# Altium footprint library LimeMicroAltiumLib_pcbLib.PcbLib: 228 footprints (part 2 of 15) (continued)
## ALTR-FBGA896_A-200 [mm] "BGA, 896-Balls, Body 31x31mm, Pitch 1mm" (continued)
Top Overlay:
  circle w0.25: c-16.15,15.35 r0.125
  region: -14.5,15.5 -15.5,14.5 -15.5,15.5
  lines w0.2: -15.5,14.5 -14.5,15.5 ; -15.5,-15.5 15.5,-15.5 15.5,15.5 -15.5,15.5 -15.5,-15.5
Mechanical 13:
  lines w0.1: -15.5,-15.5 15.5,-15.5 15.5,15.5 -15.5,15.5 -15.5,-15.5
Mechanical 15:
  circle w0.35: c-15.2,15.2 r0.1
  lines w0.05: -16,-16 16,-16 16,16 -16,16 -16,-16
  lines w0.1: -0.5,0 0.5,0 ; 0,-0.5 0,0.5
  text ".Designator" at 0,0 h0.7
3D body: height 2, standoff 0.4, extent -15.5,-15.5 15.5,15.5

## AMP_MICTOR38 [mm]
pads (38):
  rect 1.27x0.43 smd: 1(-3.53,5.76) 2(3.53,5.76) 3(-3.53,5.12) 4(3.53,5.12) 5(-3.53,4.48) 6(3.53,4.48) 7(-3.53,3.84) 8(3.53,3.84) 9(-3.53,3.2) 10(3.53,3.2) 11(-3.53,2.56) 12(3.53,2.56) 13(-3.53,1.92) 14(3.53,1.92) 15(-3.53,1.28) 16(3.53,1.28) 17(-3.53,0.64) 18(3.53,0.64) 19(-3.53,0) 20(3.53,0) 21(-3.53,-0.64) 22(3.53,-0.64) 23(-3.53,-1.28) 24(3.53,-1.28) 25(-3.53,-1.92) 26(3.53,-1.92) 27(-3.53,-2.56) 28(3.53,-2.56) 29(-3.53,-3.2) 30(3.53,-3.2) 31(-3.53,-3.84) 32(3.53,-3.84) 33(-3.53,-4.48) 34(3.53,-4.48) 35(-3.53,-5.12) 36(3.53,-5.12) 37(-3.53,-5.76) 38(3.53,-5.76)
via 0,11.475 diameter 2 hole 2
via 0,5.12 diameter 1 hole 0.8
via 0,-5.12 diameter 1 hole 0.8
via 0,-2.56 diameter 1 hole 0.8
via 0,0 diameter 1 hole 0.8
via 0,2.56 diameter 1 hole 0.8
Top Overlay:
  lines w0.2: -4.5,-12 4.5,-12 4.5,13 -4.5,13 -4.5,-12
Mechanical 15:
  lines w0.3: -4.5,-12 4.5,-12 4.5,13 -4.5,13 -4.5,-12
  text ".Designator" at 0,0 h0.7
  text "1" at -3.6,6.5 h1
  text "2" at 3.1,6.5 h1
  text "37" at -3.6,-7.8 h1
  text "38" at 2,-7.7 h1

## AP7361 [mm] "Low noise LDO"
height 0.63
pads (9):
  rect 0.7x0.3 smd mask+0.05: 1(-1.375,0.975) 2(-1.375,0.325) 3(-1.375,-0.325) 4(-1.375,-0.975) 5(1.375,-0.975) 6(1.375,-0.325) 7(1.375,0.325) 8(1.375,0.975)
  rect 1.6x2.35 smd mask+0.05: 9(0,0)
Top Overlay:
  circle w0.2: c-2.3,1 r0.035
  lines w0.15: -2,-0.8 -2,-1.7 -1.4,-1.7 ; -2,0.8 -2,1.7 -1.4,1.7 ; 1.4,-1.7 2,-1.7 2,-0.8 ; 1.4,1.7 2,1.7 2,0.8
Mechanical 15:
  circle w0.2: c-1.4,0.8 r0.1
  lines w0.15: -0.4,0 0,0 ; 0,-0.4 0,0 ; 0,0.4 0,0 ; 0.4,0 0,0 ; -1.9,-1.5 -1.9,1.5 1.9,1.5 1.9,-1.5 -1.9,-1.5
  text ".Designator" at 0,0 h0.55
3D body "User Library-DFN8_3x3mm__65mm.step": height 0.8, standoff 0, extent -1.52,-1.5 1.5,1.5

## AS4C64M16D2 [mm]
height 1.2
pads (84):
  round 0.45 smd: A1(-3.2,5.6) A2(-2.4,5.6) A3(-1.6,5.6) A7(1.6,5.6) A8(2.4,5.6) A9(3.2,5.6) B1(-3.2,4.8) B2(-2.4,4.8) B3(-1.6,4.8) B7(1.6,4.8) B8(2.4,4.8) B9(3.2,4.8) C1(-3.2,4) C2(-2.4,4) C3(-1.6,4) C7(1.6,4) C8(2.4,4) C9(3.2,4) D1(-3.2,3.2) D2(-2.4,3.2) D3(-1.6,3.2) D7(1.6,3.2) D8(2.4,3.2) D9(3.2,3.2) E1(-3.2,2.4) E2(-2.4,2.4) E3(-1.6,2.4) E7(1.6,2.4) E8(2.4,2.4) E9(3.2,2.4) F1(-3.2,1.6) F2(-2.4,1.6) F3(-1.6,1.6) F7(1.6,1.6) F8(2.4,1.6) F9(3.2,1.6) G1(-3.2,0.8) G2(-2.4,0.8) G3(-1.6,0.8) G7(1.6,0.8) G8(2.4,0.8) G9(3.2,0.8) H1(-3.2,0) H2(-2.4,0) H3(-1.6,0) H7(1.6,0) H8(2.4,0) H9(3.2,0) J1(-3.2,-0.8) J2(-2.4,-0.8) J3(-1.6,-0.8) J7(1.6,-0.8) J8(2.4,-0.8) J9(3.2,-0.8) K2(-2.4,-1.6) K3(-1.6,-1.6) K7(1.6,-1.6) K8(2.4,-1.6) K9(3.2,-1.6) L1(-3.2,-2.4) L2(-2.4,-2.4) L3(-1.6,-2.4) L7(1.6,-2.4) L8(2.4,-2.4) M2(-2.4,-3.2) M3(-1.6,-3.2) M7(1.6,-3.2) M8(2.4,-3.2) M9(3.2,-3.2) N1(-3.2,-4) N2(-2.4,-4) N3(-1.6,-4) N7(1.6,-4) N8(2.4,-4) P2(-2.4,-4.8) P3(-1.6,-4.8) P7(1.6,-4.8) P8(2.4,-4.8) P9(3.2,-4.8) R1(-3.2,-5.6) R2(-2.4,-5.6) R3(-1.6,-5.6) R7(1.6,-5.6) R8(2.4,-5.6)
Top Overlay:
  circle w0.25: c-4.3,6.6 r0.125
  lines w0.1: -4.1,-6.4 -4.1,6.4 4.1,6.4 4.1,-6.4 -4.1,-6.4
Mechanical 13:
  lines w0.1: -4.1,-6.4 4.1,-6.4 4.1,6.4 -4.1,6.4 -4.1,-6.4
Mechanical 15:
  circle w0.35: c-3.6,5.6 r0.1
  lines w0.05: -4.1,-6.4 4.1,-6.4 4.1,6.35 -4.1,6.35 -4.1,-6.4
  lines w0.1: -0.5,-0.4 0.5,-0.4 ; 0,-0.9 0,0.1
  text ".Designator" at 0,-0.4 h0.7
3D body: height 1.25, standoff 0, extent -3.6,5.2 -2.8,6
3D body: height 1.2, standoff 0, extent -4,-6.25 4,6.25

## AS4C128M16D3 [mm]
height 1.2
pads (96):
  round 0.41 smd: A1(-3.2,6) A2(-2.4,6) A3(-1.6,6) A7(1.6,6) A8(2.4,6) A9(3.2,6) B1(-3.2,5.2) B2(-2.4,5.2) B3(-1.6,5.2) B7(1.6,5.2) B8(2.4,5.2) B9(3.2,5.2) C1(-3.2,4.4) C2(-2.4,4.4) C3(-1.6,4.4) C7(1.6,4.4) C8(2.4,4.4) C9(3.2,4.4) D1(-3.2,3.6) D2(-2.4,3.6) D3(-1.6,3.6) D7(1.6,3.6) D8(2.4,3.6) D9(3.2,3.6) E1(-3.2,2.8) E2(-2.4,2.8) E3(-1.6,2.8) E7(1.6,2.8) E8(2.4,2.8) E9(3.2,2.8) F1(-3.2,2) F2(-2.4,2) F3(-1.6,2) F7(1.6,2) F8(2.4,2) F9(3.2,2) G1(-3.2,1.2) G2(-2.4,1.2) G3(-1.6,1.2) G7(1.6,1.2) G8(2.4,1.2) G9(3.2,1.2) H1(-3.2,0.4) H2(-2.4,0.4) H3(-1.6,0.4) H7(1.6,0.4) H8(2.4,0.4) H9(3.2,0.4) J1(-3.2,-0.4) J2(-2.4,-0.4) J3(-1.6,-0.4) J7(1.6,-0.4) J8(2.4,-0.4) J9(3.2,-0.4) K1(-3.2,-1.2) K2(-2.4,-1.2) K3(-1.6,-1.2) K7(1.6,-1.2) K8(2.4,-1.2) K9(3.2,-1.2) L1(-3.2,-2) L2(-2.4,-2) L3(-1.6,-2) L7(1.6,-2) L8(2.4,-2) L9(3.2,-2) M1(-3.2,-2.8) M2(-2.4,-2.8) M3(-1.6,-2.8) M7(1.6,-2.8) M8(2.4,-2.8) M9(3.2,-2.8) N1(-3.2,-3.6) N2(-2.4,-3.6) N3(-1.6,-3.6) N7(1.6,-3.6) N8(2.4,-3.6) N9(3.2,-3.6) P1(-3.2,-4.4) P2(-2.4,-4.4) P3(-1.6,-4.4) P7(1.6,-4.4) P8(2.4,-4.4) P9(3.2,-4.4) R1(-3.2,-5.2) R2(-2.4,-5.2) R3(-1.6,-5.2) R7(1.6,-5.2) R8(2.4,-5.2) R9(3.2,-5.2) T1(-3.2,-6) T2(-2.4,-6) T3(-1.6,-6) T7(1.6,-6) T8(2.4,-6) T9(3.2,-6)
Top Overlay:
  circle w0.25: c-4.71,6.71 r0.125
  lines w0.1: -4.5,-6.5 4.5,-6.5 4.5,6.5 -4.5,6.5 -4.5,-6.5
Mechanical 13:
  lines w0.1: -4.5,-6.5 -4.5,6.5 4.5,6.5 4.5,-6.5 -4.5,-6.5
Mechanical 15:
  circle w0.35: c-4.3,6.3 r0.1
  lines w0.05: -4.75,-6.75 -4.75,6.75 4.75,6.75 4.75,-6.75 -4.75,-6.75
  lines w0.1: -0.5,0 0.5,0 ; 0,-0.5 0,0.5
  text ".Designator" at 0,0 h0.7
3D body: height 1.2, standoff 0.25, extent -4.5,-6.5 4.5,6.5

## ATX4PIN12V_MOLEX [mm]
pads (4):
  rrect50% 3x3 hole 1.4: 1(-2.1,2.75)
  round 3 hole 1.4: 2(2.1,2.75) 3(-2.1,-2.75) 4(2.1,-2.75)
Top Overlay:
  lines w0.2: -0.9,-5.85 -0.9,-6.55 1.1,-6.55 1.1,-5.85 ; -5.3,-5.8 -5.3,5.1 5.4,5.1 5.4,-5.8 -5.3,-5.8
Mechanical 15:
  lines w0.2: -0.9,-5.85 -0.9,-6.55 1.1,-6.55 1.1,-5.85 ; -5.3,-5.8 5.4,-5.8 5.4,5.1 -5.3,5.1 -5.3,-5.8
  text ".Designator" at -0.1,-0.25 h0.7
3D body "039281043.stp": height 12.8, standoff -3.5, extent -5.2,-6 5.2,5

## ATX4PIN12V_MOLEX_HORIZONTAL [mm]
pads (5):
  round 3 hole 3.1: 0(0,-10.05)
  rrect50% 3.5x3.5 hole 1.8: 1(2.1,-2.75)
  round 3.5 hole 1.8: 2(-2.1,-2.75) 3(2.1,2.75) 4(-2.1,2.75)
Top Overlay:
  lines w0.2: -5,-16.6 -5,5.1 5.35,5.1 5.35,-16.6 -5,-16.6
Mechanical 15:
  lines w0.2: -5,-16.6 5.35,-16.6 5.35,5.1 -5,5.1 -5,-16.6
  text ".Designator" at -0.1,-0.25 h0.7
3D body "039301041.stp": height 11.4, standoff -3.6, extent -4.8,-16.668 5.2,3.268

## BF1105R_SOT143R4 [mm] "RF MOSFET Transistors Trans MOSFET N-CH 7V 0.03A 4pin(3+Tab). SOT-143R-4 package"
pads (4):
  rect 1x0.7 smd: 1(0.763,-0.987)
  rect 0.7x0.7 smd: 2(-0.962,-0.987) 3(-0.937,0.988) 4(0.963,0.988)
Top Overlay:
  circle w0.15: c0.75,-1.65 r0.075
  lines w0.1: -1.5,-0.6 -1.5,0.625 ; 1.525,-0.6 1.525,0.625
Mechanical 15:
  circle w0.15: c0.75,-0.975 r0.056
  lines w0.1: -1.5,-1.4 -1.5,1.4 1.525,1.4 1.525,-1.4 -1.5,-1.4
  text ".Designator" at 0,0 h0.55
3D body "User Library-SOT143R.STEP": height 0.95, standoff 0.02, extent -1.438,-1.262 1.463,1.238

## BSC093N04LS_G [mm] "SON, 8-Leads, Body 5,32x6,15mm, Pitch 1,27mm, Thermal Pad 3,60x4,05mm, IPC Medium Density"
height 1.1
pads (9):
  rect 1.2x0.5 smd: 1(-2.87,1.905) 2(-2.87,0.635) 3(-2.87,-0.635) 4(-2.87,-1.905) 5(2.87,-1.905) 6(2.87,-0.635) 7(2.87,0.635) 8(2.87,1.905)
  rect 4.05x4.3 smd paste-2.025: 8(1,0)
Top Overlay:
  circle w0.1: c-3.725,2.895 r0.05
  lines w0.2: -3.325,-2.555 -3.325,-2.895 -2.37,-2.895 ; -3.325,2.555 -3.325,2.895 -2.37,2.895 ; 2.37,-2.895 3.325,-2.895 3.325,-2.555 ; 2.37,2.895 3.325,2.895 3.325,2.555
Mechanical 13:
  circle w0.1: c-2.275,1.845 r0.5
  lines w0.1: -3.175,-2.745 3.175,-2.745 3.175,2.745 -3.175,2.745 -3.175,-2.745
Mechanical 15:
  circle w0.35: c-3,2.6 r0.1
  lines w0.05: -3.73,-3 3.73,-3 3.73,3 -3.73,3 -3.73,-3
  lines w0.1: -0.5,0 0.5,0 ; 0,-0.5 0,0.5
  text ".Designator" at 0,0 h0.7
3D body: height 1.1, standoff 0.2, extent -3.175,-2.745 3.175,2.745

## CAP0201 [mm]
pads (2):
  rect 0.3x0.35 smd: 1(-0.28,0) 2(0.28,0)
Top Overlay:
  lines w0.1: -0.2,-0.325 0.175,-0.325 ; -0.175,0.325 0.2,0.325 ; 0,-0.15 0,0.15
Mechanical 15:
  lines w0.1: -0.475,-0.225 0.475,-0.225 0.475,0.225 -0.475,0.225 -0.475,-0.225
  text ".Designator" at 0,0 h0.7
3D body: height 0.25, standoff 0, extent -0.17,-0.15 0.17,0.15
3D body: height 0.25, standoff 0, extent -0.3,-0.15 -0.17,0.15
3D body: height 0.25, standoff 0, extent 0.17,-0.15 0.3,0.15

## CAP0402 [mm] "Chip Capacitor, Body 1.0x0.5mm, 0402, IPC Medium Density"
height 0.55
pads (3):
  round 0.2 on Mech15: 0(0,0)
  rrect20% 0.6x0.5 smd: 1(-0.5,0) 2(0.5,0)
Top Layer:
  pour cut-out: -0.2,0.35 0.2,0.35 0.2,-0.35 -0.2,-0.35
Top Overlay:
  lines w0.127: -0.25,-0.5 -1.05,-0.5 -1.05,0.5 -0.25,0.5 ; 0.25,-0.5 1.05,-0.5 1.05,0.5 0.25,0.5
Mechanical 13:
  lines w0.05: -0.325,-0.255 0.325,-0.255 ; -0.325,0.255 0.325,0.255 ; -0.525,-0.275 -0.325,-0.275 -0.325,0.275 -0.525,0.275 -0.525,-0.275 ; 0.325,-0.275 0.325,0.275 0.525,0.275 0.525,-0.275 0.325,-0.275
Mechanical 15:
  lines w0.1: -1.05,-0.5 1.05,-0.5 1.05,0.5 -1.05,0.5 -1.05,-0.5
  text ".Designator" at 0,0 h0.7
3D body "CAP 0402 (1005 metric).STEP": height 0.55, standoff 0, extent -0.525,-0.275 0.525,0.275

## CAP0603 [mm] "Chip Capacitor, Body 1.6x0.8mm, 0603, IPC Medium Density"
height 0.8
pads (3):
  round 0.254 on Mech15: 0(0,0)
  rrect25% 0.9x1 smd: 1(-0.85,0) 2(0.85,0)
Top Layer:
  pour cut-out: -0.4,0.6 0.4,0.6 0.4,-0.6 -0.4,-0.6
Top Overlay:
  lines w0.127: -0.178,-0.476 -0.178,0.476 ; 0.178,-0.476 0.178,0.476
Mechanical 13:
  lines w0.05: -0.55,-0.43 0.55,-0.43 ; -0.55,0.43 0.55,0.43 ; -0.85,-0.45 -0.55,-0.45 -0.55,0.45 -0.85,0.45 -0.85,-0.45 ; 0.55,-0.45 0.85,-0.45 0.85,0.45 0.55,0.45 0.55,-0.45
Mechanical 15:
  lines w0.1: -1.5,-0.7 1.5,-0.7 1.5,0.7 -1.5,0.7 -1.5,-0.7
  text ".Designator" at 0,0 h0.7
3D body "CAP_0603.STEP": height 0.89, standoff -0.01, extent -0.85,-0.45 0.85,0.45

## CAP0805 [mm] "Chip Capacitor, Body 2.0x1.2mm, 0805, IPC Medium Density"
height 1.2
pads (3):
  round 0.254 on Mech15: 0(0,0)
  rrect25% 1x1.4 smd: 1(-0.9,0) 2(0.9,0)
Top Layer:
  pour cut-out: -0.4,0.8 0.4,0.8 0.4,-0.8 -0.4,-0.8
Top Overlay:
  lines w0.127: -0.15,-0.651 -0.15,0.651 ; 0.15,-0.651 0.15,0.651
Mechanical 13:
  lines w0.05: -0.8,-0.705 0.8,-0.705 ; -0.8,0.705 0.8,0.705 ; -1.1,-0.725 -0.8,-0.725 -0.8,0.725 -1.1,0.725 -1.1,-0.725 ; 0.8,-0.725 0.8,0.725 1.1,0.725 1.1,-0.725 0.8,-0.725
Mechanical 15:
  lines w0.1: -1.6,-0.9 1.6,-0.9 1.6,0.9 -1.6,0.9 -1.6,-0.9
  text ".Designator" at 0,0 h0.7
3D body "CAP_0805.STEP": height 1.34, standoff -0.01, extent -1.1,-0.725 1.1,0.725

## CAP0805_POL [mm] "Chip Capacitor, Body 2.0x1.2mm, 0805, IPC Medium Density"
height 1.2
pads (3):
  round 0.254 on Mech15: 0(0,0)
  rrect25% 1x1.4 smd: 1(-0.9,0) 2(0.9,0)
Top Layer:
  pour cut-out: -0.4,0.8 0.4,0.8 0.4,-0.8 -0.4,-0.8
Top Overlay:
  lines w0.127: -0.15,-0.651 -0.15,0.651 ; 0.15,-0.651 0.15,0.651
  lines w0.2: -1.25,-1.25 -0.75,-1.25 ; -1,-1.5 -1,-1
Mechanical 13:
  lines w0.05: -0.8,-0.705 0.8,-0.705 ; -0.8,0.705 0.8,0.705 ; -1.1,-0.725 -1.1,0.725 -0.8,0.725 -0.8,-0.725 -1.1,-0.725 ; 0.8,-0.725 1.1,-0.725 1.1,0.725 0.8,0.725 0.8,-0.725
Mechanical 15:
  lines w0.1: -1.6,-0.9 -1.6,0.9 1.6,0.9 1.6,-0.9 -1.6,-0.9
  lines w0.2: -1.25,-1.25 -0.75,-1.25 ; -1,-1.5 -1,-1
  text ".Designator" at 0,0 h0.7
3D body "CAP_0805.STEP": height 1.34, standoff -0.01, extent -1.1,-0.725 1.1,0.725